# Altium footprint library Библиотека посадочных мест.PcbLib: 128 footprints (part 1 of 8)
Each footprint in its own frame and in the unit in brackets; x right, y up, seen from the top. Pads: shape width x height; smd on the part's side, far side on the other; paste and mask are expansions set on the pad; w line width, h text height; cw(c..) or ccw(c..) is an arc to the next point about the centre after c.
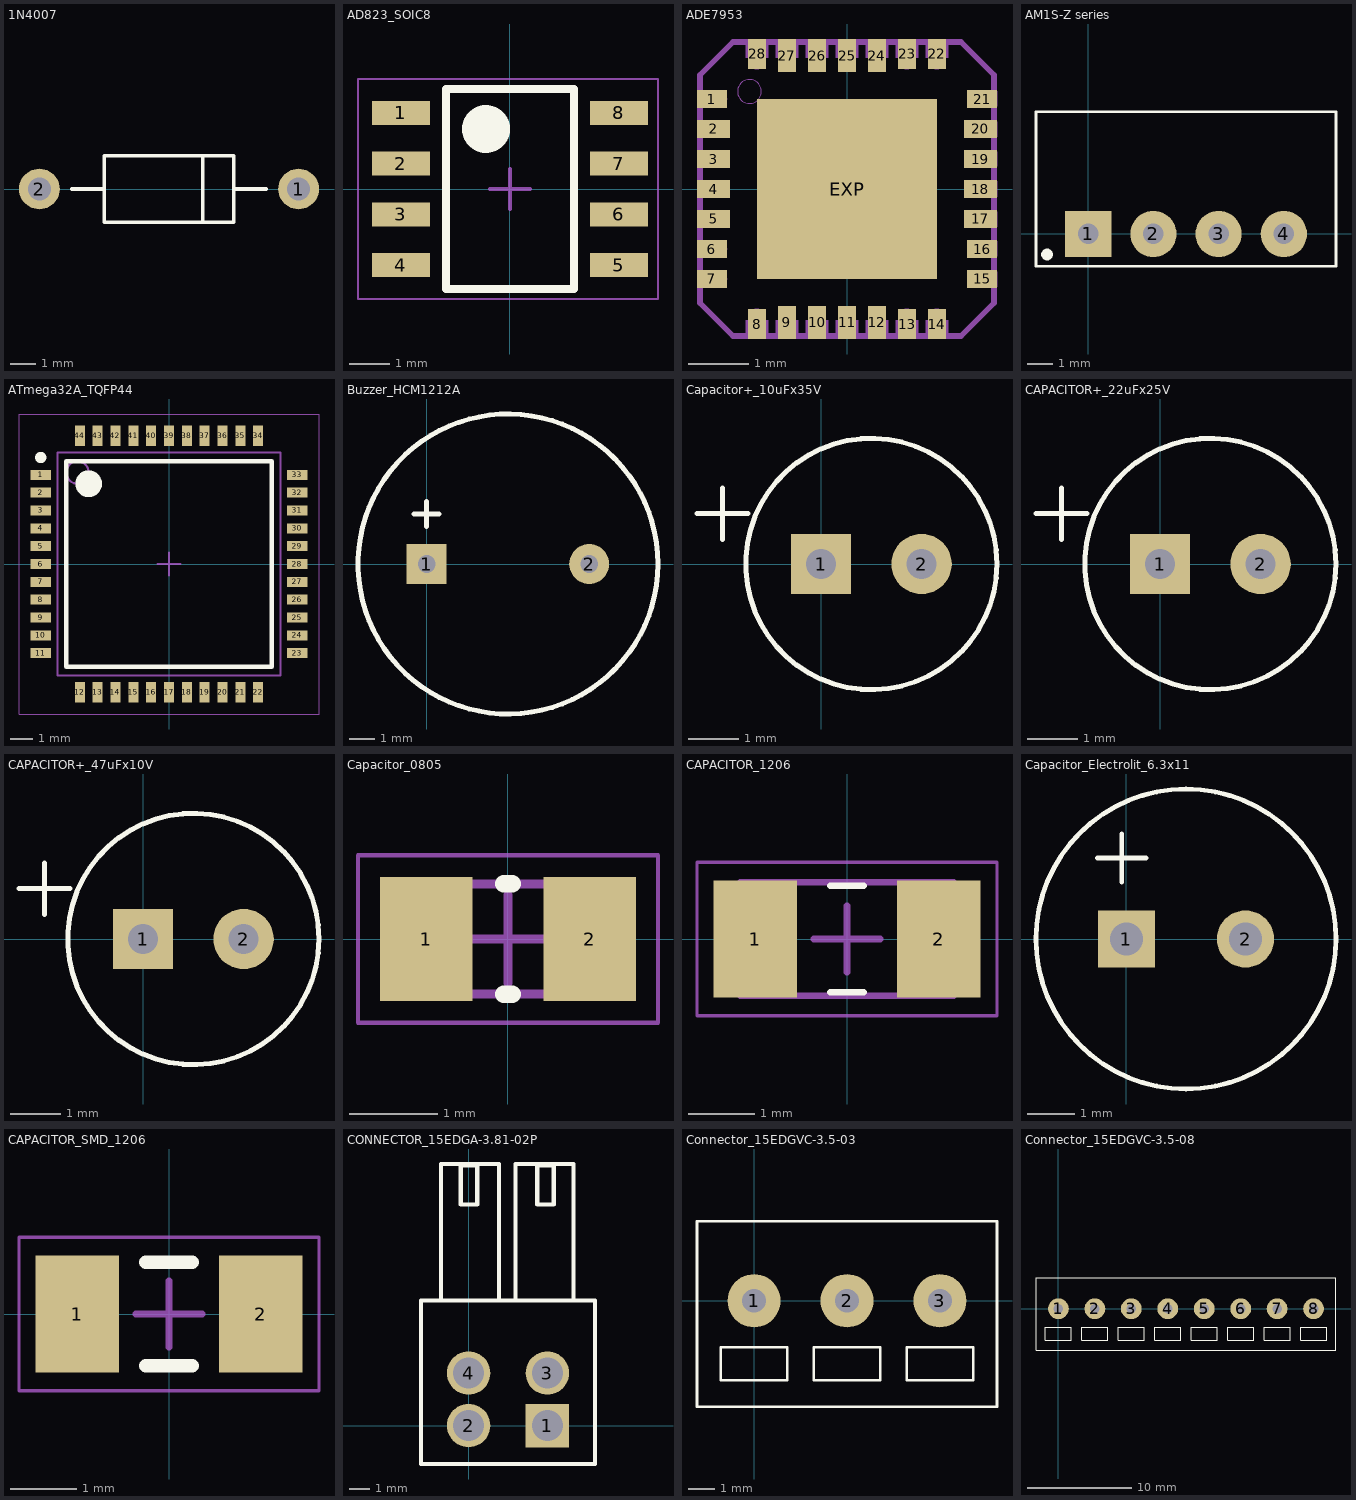
[diagram p0: the footprints below, top view; thin cyan lines are the x and y axes]

## 1N4007 [mm]
pads (2):
  round 1.6 hole 0.9: 1(15.24,0) 2(5.08,0)
Top Overlay:
  lines w0.15: 6.35,0 7.62,0 ; 7.62,1.27 7.62,-1.3 12.7,-1.3 ; 7.62,1.3 12.7,1.3 ; 11.485,-1.3 11.485,1.3 ; 12.7,-1.27 12.7,1.27 ; 12.7,0 13.97,0
3D body "User Library-DO-41-2.STEP": height 2.72, standoff -2.6, extent 4.648,-1.36 15.672,1.36

## AD823_SOIC8 [mm]
height 1.75
pads (8):
  rect 1.45x0.6 smd: 1(-2.725,1.905) 2(-2.725,0.635) 3(-2.725,-0.635) 4(-2.725,-1.905) 5(2.725,-1.905) 6(2.725,-0.635) 7(2.725,0.635) 8(2.725,1.905)
Top Overlay:
  circle w0.6: c-0.6,1.5 r0.3
  lines w0.2: -1.6,-2.5 -1.6,2.5 1.6,2.5 1.6,-2.5 -1.6,-2.5
Mechanical 15:
  lines w0.05: -3.8,-2.75 -3.8,2.75 3.7,2.75 3.7,-2.75 -3.8,-2.75
  lines w0.1: -0.5,0 0.5,0 ; 0,-0.5 0,0.5
3D body "R_8.step": height 1.76, standoff 0, extent -3.099,-2.502 3.099,2.502

## ADE7953 [mm]
pads (29):
  rect 0.5x0.3 smd: 1(-2.25,1.5) 6(-2.25,-1) 7(-2.25,-1.5) 15(2.25,-1.5) 16(2.25,-1) 21(2.25,1.5)
  rect 0.55x0.3 smd: 2(-2.225,1) 3(-2.225,0.5) 4(-2.225,0) 5(-2.225,-0.5) 17(2.225,-0.5) 18(2.225,0) 19(2.225,0.5) 20(2.225,1)
  rect 0.3x0.5 smd: 8(-1.5,-2.25) 13(1,-2.25) 14(1.5,-2.25) 22(1.5,2.25) 23(1,2.25) 28(-1.5,2.25)
  rect 0.3x0.55 smd: 9(-1,-2.225) 10(-0.5,-2.225) 11(0,-2.225) 12(0.5,-2.225) 24(0.5,2.225) 25(0,2.225) 26(-0.5,2.225) 27(-1,2.225)
  rect 3x3 smd: EXP(0,0)
Top Paste:
  region: -2.475,1.625 -2.025,1.625 -2.025,1.375 -2.475,1.375
  region: -2.475,1.125 -1.975,1.125 -1.975,0.875 -2.475,0.875
  region: -2.475,0.625 -1.975,0.625 -1.975,0.375 -2.475,0.375
  region: -2.475,0.125 -1.975,0.125 -1.975,-0.125 -2.475,-0.125
  region: -2.475,-0.375 -1.975,-0.375 -1.975,-0.625 -2.475,-0.625
  region: -2.475,-0.875 -2.025,-0.875 -2.025,-1.125 -2.475,-1.125
  region: -1.225,-2.125 -0.775,-2.125 -0.775,-2.375 -1.225,-2.375
  region: -0.75,-2.1 -0.25,-2.1 -0.25,-2.35 -0.75,-2.35
  region: -0.25,-2.1 0.25,-2.1 0.25,-2.35 -0.25,-2.35
  region: 0.25,-2.1 0.75,-2.1 0.75,-2.35 0.25,-2.35
  region: 0.75,-2.1 1.25,-2.1 1.25,-2.35 0.75,-2.35
  region: 1.275,-2.125 1.725,-2.125 1.725,-2.375 1.275,-2.375
  region: 2.025,-0.875 2.475,-0.875 2.475,-1.125 2.025,-1.125
  region: 1.975,-0.375 2.475,-0.375 2.475,-0.625 1.975,-0.625
  region: 1.975,0.125 2.475,0.125 2.475,-0.125 1.975,-0.125
  region: 1.975,0.625 2.475,0.625 2.475,0.375 1.975,0.375
  region: 1.975,1.125 2.475,1.125 2.475,0.875 1.975,0.875
  region: 2.025,1.625 2.475,1.625 2.475,1.375 2.025,1.375
  region: 0.775,2.375 1.225,2.375 1.225,2.125 0.775,2.125
  region: 0.25,2.35 0.75,2.35 0.75,2.1 0.25,2.1
  region: -0.25,2.35 0.25,2.35 0.25,2.1 -0.25,2.1
  region: -0.75,2.35 -0.25,2.35 -0.25,2.1 -0.75,2.1
  region: -1.25,2.35 -0.75,2.35 -0.75,2.1 -1.25,2.1
  region: -1.725,2.375 -1.275,2.375 -1.275,2.125 -1.725,2.125
  region: -1.05,1.05 1.05,1.05 1.05,-1.05 -1.05,-1.05
  region: -2.475,-1.375 -2.025,-1.375 -2.025,-1.625 -2.475,-1.625
  region: -1.725,-2.125 -1.275,-2.125 -1.275,-2.375 -1.725,-2.375
  region: 2.025,-1.375 2.475,-1.375 2.475,-1.625 2.025,-1.625
  region: 1.275,2.375 1.725,2.375 1.725,2.125 1.275,2.125
Top Solder:
  region: -2.5,1.65 -2,1.65 -2,1.35 -2.5,1.35
  region: -2.5,1.15 -1.95,1.15 -1.95,0.85 -2.5,0.85
  region: -2.5,0.65 -1.95,0.65 -1.95,0.35 -2.5,0.35
  region: -2.5,0.15 -1.95,0.15 -1.95,-0.15 -2.5,-0.15
  region: -2.5,-0.35 -1.95,-0.35 -1.95,-0.65 -2.5,-0.65
  region: -2.5,-0.85 -2,-0.85 -2,-1.15 -2.5,-1.15
  region: -1.25,-2.1 -0.75,-2.1 -0.75,-2.4 -1.25,-2.4
  region: -0.775,-2.075 -0.225,-2.075 -0.225,-2.375 -0.775,-2.375
  region: -0.275,-2.075 0.275,-2.075 0.275,-2.375 -0.275,-2.375
  region: 0.225,-2.075 0.775,-2.075 0.775,-2.375 0.225,-2.375
  region: 0.725,-2.075 1.275,-2.075 1.275,-2.375 0.725,-2.375
  region: 1.25,-2.1 1.75,-2.1 1.75,-2.4 1.25,-2.4
  region: 2,-0.85 2.5,-0.85 2.5,-1.15 2,-1.15
  region: 1.95,-0.35 2.5,-0.35 2.5,-0.65 1.95,-0.65
  region: 1.95,0.15 2.5,0.15 2.5,-0.15 1.95,-0.15
  region: 1.95,0.65 2.5,0.65 2.5,0.35 1.95,0.35
  region: 1.95,1.15 2.5,1.15 2.5,0.85 1.95,0.85
  region: 2,1.65 2.5,1.65 2.5,1.35 2,1.35
  region: 0.75,2.4 1.25,2.4 1.25,2.1 0.75,2.1
  region: 0.225,2.375 0.775,2.375 0.775,2.075 0.225,2.075
  region: -0.275,2.375 0.275,2.375 0.275,2.075 -0.275,2.075
  region: -0.775,2.375 -0.225,2.375 -0.225,2.075 -0.775,2.075
  region: -1.275,2.375 -0.725,2.375 -0.725,2.075 -1.275,2.075
  region: -1.75,2.4 -1.25,2.4 -1.25,2.1 -1.75,2.1
  region: -1,1 1,1 1,-1 -1,-1
  region: -2.5,-1.35 -2,-1.35 -2,-1.65 -2.5,-1.65
  region: -1.75,-2.1 -1.25,-2.1 -1.25,-2.4 -1.75,-2.4
  region: 2,-1.35 2.5,-1.35 2.5,-1.65 2,-1.65
  region: 1.25,2.4 1.75,2.4 1.75,2.1 1.25,2.1
Mechanical 4:
  drawing of 130 lines, arcs and shapes, not listed
3D body "CP_28_10.step": height 0.79, standoff 0, extent -2.553,-2.553 2.553,2.553

## AM1S-Z series [mm] "DC-DC converter (1 Watt )"
height 9.65
pads (4):
  rect 1.8x1.8 hole 0.8: 1(0,0)
  round 1.8 hole 0.8: 2(2.54,0) 3(5.08,0) 4(7.62,0)
Top Overlay:
  circle w0.254: c-1.6,-0.8 r0.1
  lines w0.1: -2.03,-1.25 9.65,-1.25 9.65,4.75 -2.03,4.75 -2.03,-1.25
3D body "AM1S-1205SZ.step": height 10.16, standoff -4.57, extent -2.032,-1.25 9.652,4.744

## ATmega32A_TQFP44 [mm]
height 1.2
pads (44):
  rect 0.9x0.45 smd: 1(-5.75,4) 2(-5.75,3.2) 3(-5.75,2.4) 4(-5.75,1.6) 5(-5.75,0.8) 6(-5.75,0) 7(-5.75,-0.8) 8(-5.75,-1.6) 9(-5.75,-2.4) 10(-5.75,-3.2) 11(-5.75,-4) 23(5.75,-4) 24(5.75,-3.2) 25(5.75,-2.4) 26(5.75,-1.6) 27(5.75,-0.8) 28(5.75,0) 29(5.75,0.8) 30(5.75,1.6) 31(5.75,2.4) 32(5.75,3.2) 33(5.75,4)
  rect 0.45x0.9 smd: 12(-4,-5.75) 13(-3.2,-5.75) 14(-2.4,-5.75) 15(-1.6,-5.75) 16(-0.8,-5.75) 17(0,-5.75) 18(0.8,-5.75) 19(1.6,-5.75) 20(2.4,-5.75) 21(3.2,-5.75) 22(4,-5.75) 34(4,5.75) 35(3.2,5.75) 36(2.4,5.75) 37(1.6,5.75) 38(0.8,5.75) 39(0,5.75) 40(-0.8,5.75) 41(-1.6,5.75) 42(-2.4,5.75) 43(-3.2,5.75) 44(-4,5.75)
Top Overlay:
  circle w0.6: c-3.6,3.6 r0.3
  circle w0.25: c-5.75,4.775 r0.125
  lines w0.2: -4.6,-4.6 4.6,-4.6 4.6,4.6 -4.6,4.6 -4.6,-4.6
Mechanical 13:
  circle w0.1: c-4.1,4.1 r0.5
  lines w0.1: -5,-5 5,-5 5,5 -5,5 -5,-5
Mechanical 15:
  lines w0.05: -6.725,-6.725 6.725,-6.725 6.725,6.725 -6.725,6.725 -6.725,-6.725
  lines w0.1: -0.5,0 0.5,0 ; 0,-0.5 0,0.5
3D body "TQFP44.step": height 1.2, standoff 0, extent -6,-6 6,6

## Buzzer_HCM1212A [mm]
pads (2):
  rect 1.6x1.6 hole 0.7: 1(0,0)
  round 1.6 hole 0.7: 2(6.5,0)
Top Overlay:
  circle w0.2: c3.25,0 r6
  lines w0.2: -0.5,2 0.5,2 ; 0,1.5 0,2.5
3D body "HCM1206X.stp": height 9.5, standoff -2.6, extent -2.75,-6 9.25,6

## Capacitor+_10uFx35V [mm]
pads (2):
  rect 1.2x1.2 hole 0.6: 1(0,0)
  round 1.2 hole 0.6: 2(2,0)
Top Overlay:
  circle w0.1: c1,0 r2.5
  lines w0.1: -2.468,1 -1.452,1 ; -1.96,0.492 -1.96,1.508
3D body "User Library-NICHICON_ USA1C100MCA_10MF_16V_RADIAL_Alumium Electrolytic Capacitor.STEP": height 7.19, standoff -2.29, extent -1.108,-2.108 3.108,2.108

## CAPACITOR+_22uFx25V [mm]
pads (2):
  rect 1.2x1.2 hole 0.6: 1(0,0)
  round 1.2 hole 0.6: 2(2,0)
Top Overlay:
  circle w0.1: c1,0 r2.5
  lines w0.1: -2.468,1 -1.452,1 ; -1.96,0.492 -1.96,1.508
3D body "User Library-NICHICON_ USA1C100MCA_10MF_16V_RADIAL_Alumium Electrolytic Capacitor.STEP": height 7.19, standoff -2.29, extent -1.108,-2.108 3.108,2.108

## CAPACITOR+_47uFx10V [mm]
pads (2):
  rect 1.2x1.2 hole 0.6: 1(0,0)
  round 1.2 hole 0.6: 2(2,0)
Top Overlay:
  circle w0.1: c1,0 r2.5
  lines w0.1: -2.468,1 -1.452,1 ; -1.96,0.492 -1.96,1.508
3D body "User Library-NICHICON_ USA1C100MCA_10MF_16V_RADIAL_Alumium Electrolytic Capacitor.STEP": height 7.19, standoff -2.29, extent -1.108,-2.108 3.108,2.108

## Capacitor_0805 [mm]
height 1.3
pads (2):
  rect 1.05x1.4 smd: 1(-0.925,0) 2(0.925,0)
Top Overlay:
  lines w0.2: -0.05,-0.625 0.05,-0.625 ; -0.05,0.625 0.05,0.625
Mechanical 13:
  lines w0.1: -1,-0.625 -1,0.625 1,0.625 1,-0.625 -1,-0.625
Mechanical 15:
  lines w0.05: -1.7,-0.95 -1.7,0.95 1.7,0.95 1.7,-0.95 -1.7,-0.95
  lines w0.1: -0.5,0 0.5,0 ; 0,-0.5 0,0.5
3D body "Chip2PinSM127P600-8N.step": height 1.3, standoff 0, extent -1,-0.625 1,0.625

## CAPACITOR_1206 [mm] "Chip Capacitor, 2-Leads, Body 3,10x1,60mm, IPC Medium Density"
height 0.6
pads (2):
  rect 1.25x1.75 smd: 1(-1.375,0) 2(1.375,0)
Top Overlay:
  lines w0.1: -0.25,-0.8 0.25,-0.8 ; -0.25,0.8 0.25,0.8
Mechanical 13:
  lines w0.1: -1.6,-0.85 1.6,-0.85 1.6,0.85 -1.6,0.85 -1.6,-0.85
Mechanical 15:
  lines w0.05: -2.25,-1.15 2.25,-1.15 2.25,1.15 -2.25,1.15 -2.25,-1.15
  lines w0.1: -0.5,0 0.5,0 ; 0,-0.5 0,0.5
3D body: height 0.6, standoff 0, extent 1.1,-0.85 1.6,0.85
3D body: height 0.6, standoff 0, extent -1.6,-0.85 -1.1,0.85
3D body: height 0.6, standoff 0, extent -1.1,-0.85 1.1,0.85

## Capacitor_Electrolit_6.3x11 [mm]
pads (2):
  rect 1.2x1.2 hole 0.7: 1(0,0)
  round 1.2 hole 0.7: 2(2.5,0)
Top Overlay:
  circle w0.1: c1.25,0 r3.15
  lines w0.1: -0.608,1.7 0.408,1.7 ; -0.1,1.192 -0.1,2.208
3D body "User Library-Cap electrolitic radial 6,3x11.STEP": height 11.8, standoff -0.7, extent -1.874,-3.149 4.424,3.15

## CAPACITOR_SMD_1206 [mm]
height 1.5
pads (2):
  rect 1.25x1.75 smd: 1(-1.375,0) 2(1.375,0)
Top Overlay:
  lines w0.2: -0.35,-0.775 0.35,-0.775 ; -0.35,0.775 0.35,0.775
Mechanical 15:
  lines w0.05: -2.25,-1.15 2.25,-1.15 2.25,1.15 -2.25,1.15 -2.25,-1.15
  lines w0.1: -0.5,0 0.5,0 ; 0,-0.5 0,0.5

## CONNECTOR_15EDGA-3.81-02P [mm]
pads (4):
  rect 2.1x2.1 hole 1.5: 1(3.81,0)
  round 2.1 hole 1.5: 2(0,0) 3(3.81,2.54) 4(0,2.54)
Top Overlay:
  lines w0.2: -1.33,6.05 -1.33,12.65 1.47,12.65 1.47,6.05 ; 2.27,6.05 2.27,12.65 5.07,12.65 5.07,6.05 ; -2.3,-1.86 6.11,-1.86 6.11,6.04 -2.3,6.04 -2.3,-1.86 ; -0.38,10.69 0.42,10.69 0.42,12.59 -0.38,12.59 -0.38,10.69 ; 3.32,10.69 4.12,10.69 4.12,12.59 3.32,12.59 3.32,10.69
3D body "15EDGA-3.81-02P.stp": height 11.4, standoff 0.3, extent -1.905,-2.035 5.715,13.465

## Connector_15EDGVC-3.5-03 [mm]
height 9.2
pads (3):
  round 2 hole 0.9: 1(0,0) 2(3.5,0) 3(7,0)
Top Overlay:
  lines w0.1: 1.35,-4 9.15,-4 9.15,3 1.35,3 ; 5.65,-4 -2.15,-4 -2.15,3 5.65,3 ; 2.25,-3 4.75,-3 ; 2.25,-3 2.25,-1.75 ; 2.25,-3 4.75,-3 ; 2.25,-3 2.25,-1.75 ; 2.25,-1.75 3.5,-1.75 ; 2.25,-1.75 3.5,-1.75 ; 3.5,-1.75 4.75,-1.75 ; 3.5,-1.75 4.75,-1.75 ; 4.75,-3 4.75,-1.75 ; 4.75,-3 4.75,-1.75 ; -1.25,-3 1.25,-3 1.25,-1.75 0,-1.75 -1.25,-1.75 -1.25,-3 ; 5.75,-3 8.25,-3 8.25,-1.75 7,-1.75 5.75,-1.75 5.75,-3

## Connector_15EDGVC-3.5-08 [mm]
pads (8):
  round 2 hole 0.9: 1(0,0) 2(3.5,0) 3(7,0) 4(10.5,0) 5(14,0) 6(17.5,0) 7(21,0) 8(24.5,0)
Top Overlay:
  lines w0.1: 1.35,-4 9.15,-4 ; 1.35,3 9.15,3 ; 4.85,-4 12.65,-4 ; 4.85,3 12.65,3 ; 5.65,-4 -2.15,-4 -2.15,3 5.65,3 ; 11.85,-4 19.65,-4 ; 11.85,3 19.65,3 ; 15.35,-4 23.15,-4 ; 15.35,3 23.15,3 ; 18.85,-4 26.65,-4 26.65,3 18.85,3 ; 2.25,-3 4.75,-3 ; 2.25,-3 2.25,-1.75 ; 2.25,-3 4.75,-3 ; 2.25,-3 2.25,-1.75 ; 2.25,-1.75 3.5,-1.75 ; 2.25,-1.75 3.5,-1.75 ; 3.5,-1.75 4.75,-1.75 ; 3.5,-1.75 4.75,-1.75 ; 4.75,-3 4.75,-1.75 ; 4.75,-3 4.75,-1.75 ; 5.75,-3 8.25,-3 ; 5.75,-3 5.75,-1.75 ; 5.75,-3 8.25,-3 ; 5.75,-3 5.75,-1.75 ; 5.75,-1.75 7,-1.75 ; 5.75,-1.75 7,-1.75 ; 7,-1.75 8.25,-1.75 ; 7,-1.75 8.25,-1.75 ; 8.25,-3 8.25,-1.75 ; 8.25,-3 8.25,-1.75 ; 16.25,-3 18.75,-3 ; 16.25,-3 16.25,-1.75 ; 16.25,-3 18.75,-3 ; 16.25,-3 16.25,-1.75 ; 16.25,-1.75 17.5,-1.75 ; 16.25,-1.75 17.5,-1.75 ; 17.5,-1.75 18.75,-1.75 ; 17.5,-1.75 18.75,-1.75 ; 18.75,-3 18.75,-1.75 ; 18.75,-3 18.75,-1.75 ; 19.75,-3 22.25,-3 ; 19.75,-3 19.75,-1.75 ; 19.75,-3 22.25,-3 ; 19.75,-3 19.75,-1.75 ; 19.75,-1.75 21,-1.75 ; 19.75,-1.75 21,-1.75 ; 21,-1.75 22.25,-1.75 ; 21,-1.75 22.25,-1.75 ; 22.25,-3 22.25,-1.75 ; 22.25,-3 22.25,-1.75 ; -1.25,-3 1.25,-3 1.25,-1.75 0,-1.75 -1.25,-1.75 -1.25,-3 ; 9.25,-3 11.75,-3 11.75,-1.75 10.5,-1.75 9.25,-1.75 9.25,-3 ; 12.75,-3 15.25,-3 15.25,-1.75 14,-1.75 12.75,-1.75 12.75,-3 ; 23.25,-3 25.75,-3 25.75,-1.75 24.5,-1.75 23.25,-1.75 23.25,-3